# Altium schematic symbol library FPGA_Xilinx_Virtex5.SchLib: 41 symbols (part 5 of 17) (continued)
## XC5VLX30T-FF665 (continued)
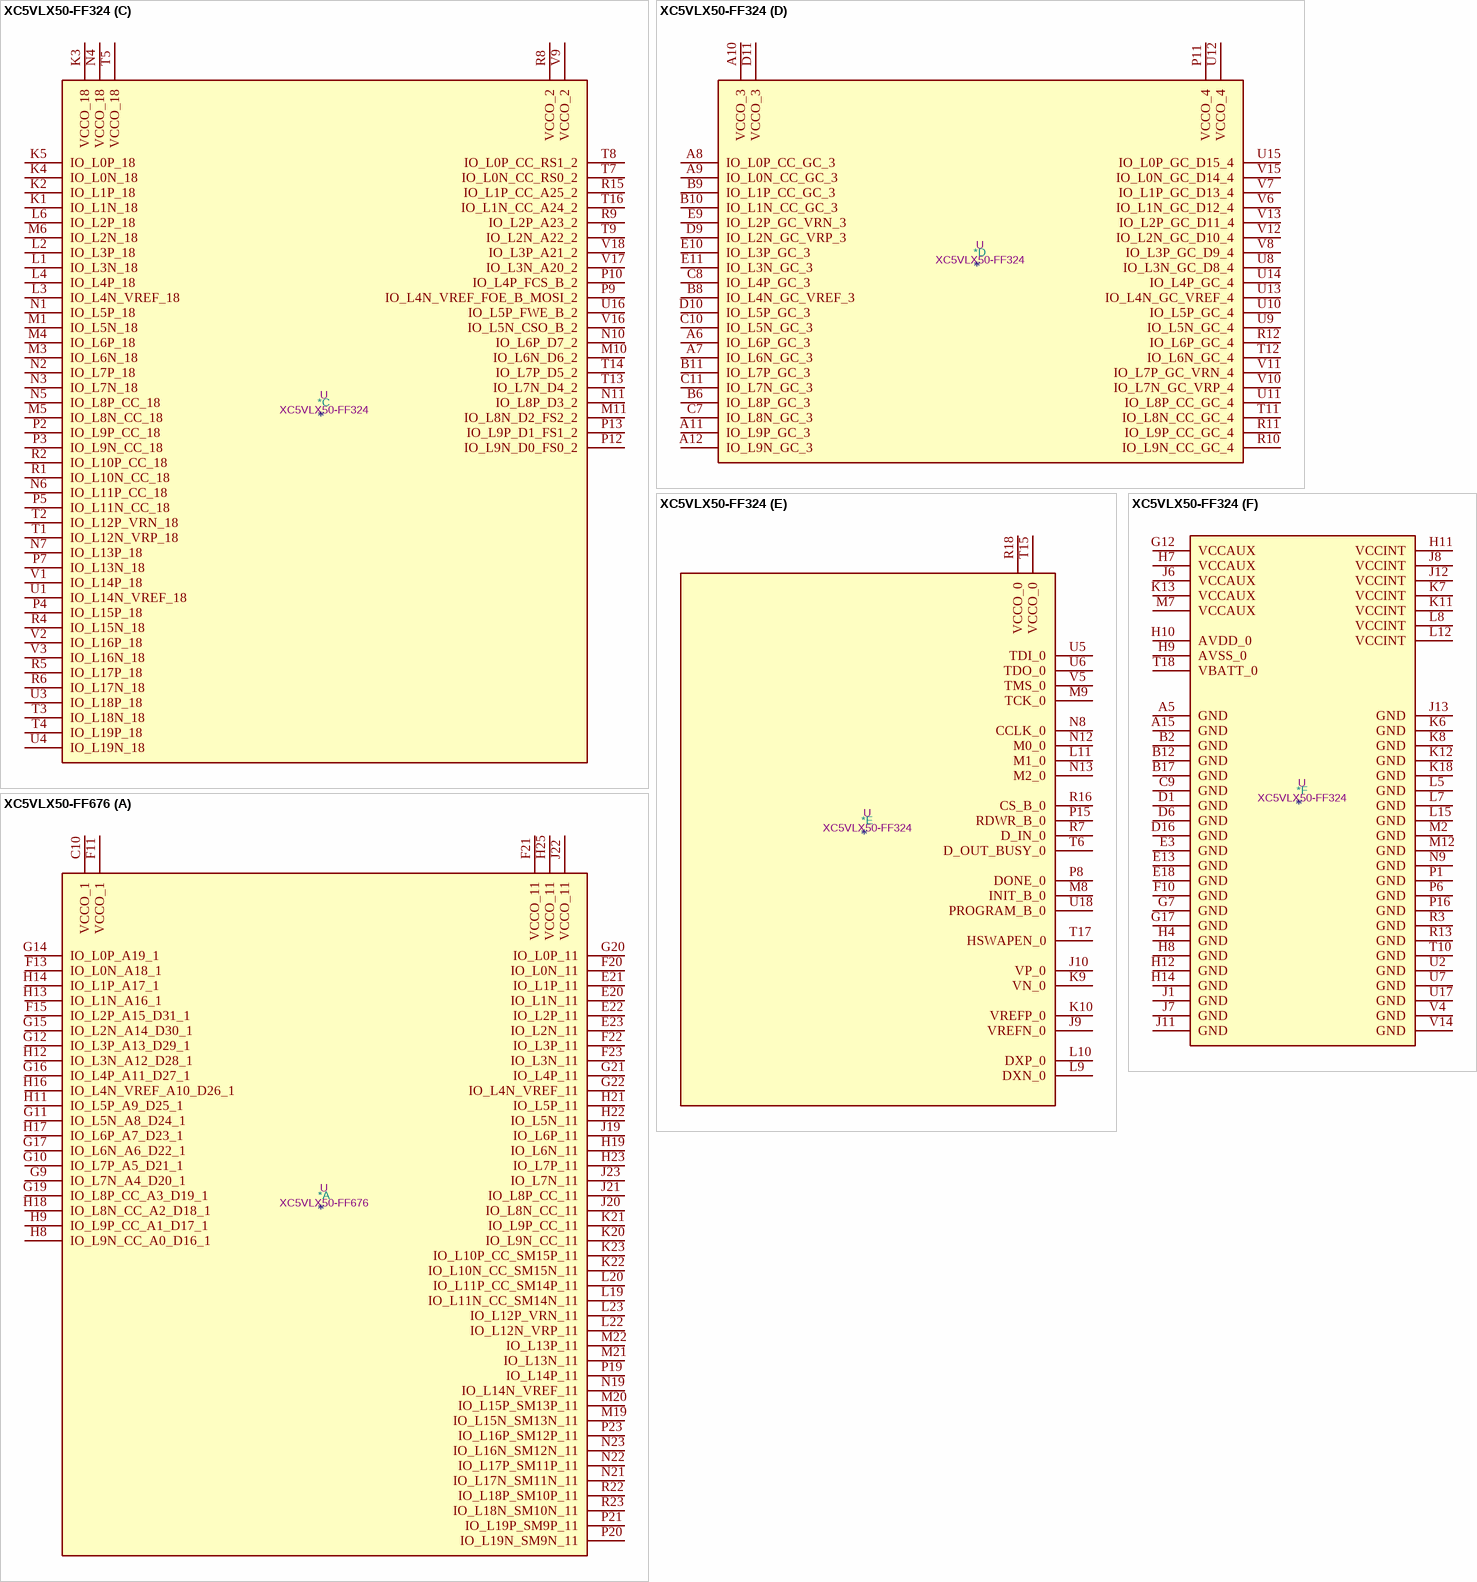
[diagram p35: symbols XC5VLX50-FF324 to XC5VLX50-FF676]

## XC5VLX50-FF324
designator *  value XC5VLX50-FF324  Reference: U
ki_keywords: FPGA; ki_description: Virtex 5 LX 50 XC5VLX50-FF324
part A pins: A13 IO_L1P_11, A14 IO_L1N_11, A16 IO_L3N_11, A17 IO_L5P_11, A18 IO_L5N_11, B7 VCCO_1, B13 IO_L6N_11, B14 IO_L2P_11, B15 IO_L2N_11, B16 IO_L3P_11, B18 IO_L7P_11, C6 IO_L9N_CC_A0_D16_1, C12 IO_L4P_A11_D27_1, C13 IO_L6P_11, C14 VCCO_11, C15 IO_L0P_11, C16 IO_L0N_11, C17 IO_L7N_11, C18 IO_L12N_VRP_11, D7 IO_L9P_CC_A1_D17_1, D8 IO_L7P_A5_D21_1, D12 IO_L2N_A14_D30_1, D13 IO_L4N_VREF_A10_D26_1, D14 IO_L4P_11, D15 IO_L11P_CC_SM14P_11, D17 IO_L10N_CC_SM15N_11, D18 IO_L12P_VRN_11, E7 IO_L7N_A4_D20_1, E8 VCCO_1, E12 IO_L2P_A15_D31_1, E14 IO_L4N_VREF_11, E15 IO_L11N_CC_SM14N_11, E16 IO_L9N_CC_11, E17 IO_L10P_CC_SM15P_11, F7 IO_L5N_A8_D24_1, F8 IO_L3P_A13_D29_1, F9 IO_L1N_A16_1, F11 IO_L0P_A19_1, F12 IO_L6P_A7_D23_1, F13 IO_L6N_A6_D22_1, F14 IO_L8P_CC_11, F15 VCCO_11, F16 IO_L9P_CC_11, F17 IO_L14N_VREF_11, F18 IO_L14P_11, G8 IO_L5P_A9_D25_1, G9 IO_L3N_A12_D28_1, G10 IO_L1P_A17_1, G11 IO_L0N_A18_1, G13 IO_L8P_CC_A3_D19_1, G14 IO_L8N_CC_11, G15 IO_L13N_11, G16 IO_L15N_SM13N_11, G18 IO_L16N_SM12N_11, H13 IO_L8N_CC_A2_D18_1, H15 IO_L13P_11, H16 IO_L15P_SM13P_11, H17 IO_L17P_SM11P_11, H18 IO_L16P_SM12P_11, J14 IO_L19N_SM9N_11, J15 IO_L19P_SM9P_11, J16 VCCO_11, J17 IO_L17N_SM11N_11, J18 IO_L18N_SM10N_11, K17 IO_L18P_SM10P_11
part B pins: A1 IO_L10P_CC_12, A2 IO_L10N_CC_12, A3 IO_L5P_12, A4 IO_L3N_12, B1 IO_L12N_VRP_12, B3 IO_L5N_12, B4 IO_L3P_12, B5 IO_L1P_12, C1 IO_L12P_VRN_12, C2 IO_L9N_CC_12, C3 IO_L7P_12, C4 VCCO_12, C5 IO_L1N_12, D2 IO_L9P_CC_12, D3 IO_L7N_12, D4 IO_L2N_12, D5 IO_L2P_12, E1 IO_L14N_VREF_12, E2 IO_L18P_12, E4 IO_L4N_VREF_12, E5 IO_L4P_12, E6 IO_L0P_12, F1 IO_L14P_12, F2 IO_L18N_12, F3 IO_L13N_12, F4 IO_L11N_CC_12, F5 VCCO_12, F6 IO_L0N_12, G1 IO_L19P_12, G2 VCCO_12, G3 IO_L13P_12, G4 IO_L11P_CC_12, G5 IO_L6P_12, G6 IO_L6N_12, H1 IO_L19N_12, H2 IO_L17P_12, H3 IO_L16P_12, H5 IO_L8N_CC_12, H6 IO_L8P_CC_12, J2 IO_L17N_12, J3 IO_L16N_12, J4 IO_L15N_12, J5 IO_L15P_12, K14 IO_L2P_SM6P_13, K15 IO_L0P_SM8P_13, K16 IO_L1N_SM7N_13, L13 IO_L4P_13, L14 IO_L2N_SM6N_13, L16 IO_L0N_SM8N_13, L17 IO_L1P_SM7P_13, L18 IO_L3N_SM5N_13, M13 IO_L4N_VREF_13, M14 IO_L6P_SM3P_13, M15 IO_L8P_CC_SM1P_13, M16 IO_L8N_CC_SM1N_13, M17 VCCO_13, M18 IO_L3P_SM5P_13, N14 VCCO_13, N15 IO_L6N_SM3N_13, N16 IO_L9P_CC_SM0P_13, N17 IO_L9N_CC_SM0N_13, N18 IO_L5N_SM4N_13, P17 IO_L7P_SM2P_13, P18 IO_L5P_SM4P_13, R17 IO_L7N_SM2N_13
part C pins: K1 IO_L1N_18, K2 IO_L1P_18, K3 VCCO_18, K4 IO_L0N_18, K5 IO_L0P_18, L1 IO_L3N_18, L2 IO_L3P_18, L3 IO_L4N_VREF_18, L4 IO_L4P_18, L6 IO_L2P_18, M1 IO_L5N_18, M3 IO_L6N_18, M4 IO_L6P_18, M5 IO_L8N_CC_18, M6 IO_L2N_18, M10 IO_L6N_D6_2, M11 IO_L8N_D2_FS2_2, N1 IO_L5P_18, N2 IO_L7P_18, N3 IO_L7N_18, N4 VCCO_18, N5 IO_L8P_CC_18, N6 IO_L11P_CC_18, N7 IO_L13P_18, N10 IO_L6P_D7_2, N11 IO_L8P_D3_2, P2 IO_L9P_CC_18, P3 IO_L9N_CC_18, P4 IO_L15P_18, P5 IO_L11N_CC_18, P7 IO_L13N_18, P9 IO_L4N_VREF_FOE_B_MOSI_2, P10 IO_L4P_FCS_B_2, P12 IO_L9N_D0_FS0_2, P13 IO_L9P_D1_FS1_2, R1 IO_L10N_CC_18, R2 IO_L10P_CC_18, R4 IO_L15N_18, R5 IO_L17P_18, R6 IO_L17N_18, R8 VCCO_2, R9 IO_L2P_A23_2, R15 IO_L1P_CC_A25_2, T1 IO_L12N_VRP_18, T2 IO_L12P_VRN_18, T3 IO_L18N_18, T4 IO_L19P_18, T5 VCCO_18, T7 IO_L0N_CC_RS0_2, T8 IO_L0P_CC_RS1_2, T9 IO_L2N_A22_2, T13 IO_L7N_D4_2, T14 IO_L7P_D5_2, T16 IO_L1N_CC_A24_2, U1 IO_L14N_VREF_18, U3 IO_L18P_18, U4 IO_L19N_18, U16 IO_L5P_FWE_B_2, V1 IO_L14P_18, V2 IO_L16P_18, V3 IO_L16N_18, V9 VCCO_2, V16 IO_L5N_CSO_B_2, V17 IO_L3N_A20_2, V18 IO_L3P_A21_2
part D pins: A6 IO_L6P_GC_3, A7 IO_L6N_GC_3, A8 IO_L0P_CC_GC_3, A9 IO_L0N_CC_GC_3, A10 VCCO_3, A11 IO_L9P_GC_3, A12 IO_L9N_GC_3, B6 IO_L8P_GC_3, B8 IO_L4N_GC_VREF_3, B9 IO_L1P_CC_GC_3, B10 IO_L1N_CC_GC_3, B11 IO_L7P_GC_3, C7 IO_L8N_GC_3, C8 IO_L4P_GC_3, C10 IO_L5N_GC_3, C11 IO_L7N_GC_3, D9 IO_L2N_GC_VRP_3, D10 IO_L5P_GC_3, D11 VCCO_3, E9 IO_L2P_GC_VRN_3, E10 IO_L3P_GC_3, E11 IO_L3N_GC_3, P11 VCCO_4, R10 IO_L9N_CC_GC_4, R11 IO_L9P_CC_GC_4, R12 IO_L6P_GC_4, T11 IO_L8N_CC_GC_4, T12 IO_L6N_GC_4, U8 IO_L3N_GC_D8_4, U9 IO_L5N_GC_4, U10 IO_L5P_GC_4, U11 IO_L8P_CC_GC_4, U12 VCCO_4, U13 IO_L4N_GC_VREF_4, U14 IO_L4P_GC_4, U15 IO_L0P_GC_D15_4, V6 IO_L1N_GC_D12_4, V7 IO_L1P_GC_D13_4, V8 IO_L3P_GC_D9_4, V10 IO_L7N_GC_VRP_4, V11 IO_L7P_GC_VRN_4, V12 IO_L2N_GC_D10_4, V13 IO_L2P_GC_D11_4, V15 IO_L0N_GC_D14_4
part E pins: J9 VREFN_0, J10 VP_0, K9 VN_0, K10 VREFP_0, L9 DXN_0, L10 DXP_0, L11 M1_0, M8 INIT_B_0, M9 TCK_0, N8 CCLK_0, N12 M0_0, N13 M2_0, P8 DONE_0, P15 RDWR_B_0, R7 D_IN_0, R16 CS_B_0, R18 VCCO_0, T6 D_OUT_BUSY_0, T15 VCCO_0, T17 HSWAPEN_0, U5 TDI_0, U6 TDO_0, U18 PROGRAM_B_0, V5 TMS_0
part F pins: A5 GND, A15 GND, B2 GND, B12 GND, B17 GND, C9 GND, D1 GND, D6 GND, D16 GND, E3 GND, E13 GND, E18 GND, F10 GND, G7 GND, G12 VCCAUX, G17 GND, H4 GND, H7 VCCAUX, H8 GND, H9 AVSS_0, H10 AVDD_0, H11 VCCINT, H12 GND, H14 GND, J1 GND, J6 VCCAUX, J7 GND, J8 VCCINT, J11 GND, J12 VCCINT, J13 GND, K6 GND, K7 VCCINT, K8 GND, K11 VCCINT, K12 GND, K13 VCCAUX, K18 GND, L5 GND, L7 GND, L8 VCCINT, L12 VCCINT, L15 GND, M2 GND, M7 VCCAUX, M12 GND, N9 GND, P1 GND, P6 GND, P16 GND, R3 GND, R13 GND, T10 GND, T18 VBATT_0, U2 GND, U7 GND, U17 GND, V4 GND, V14 GND

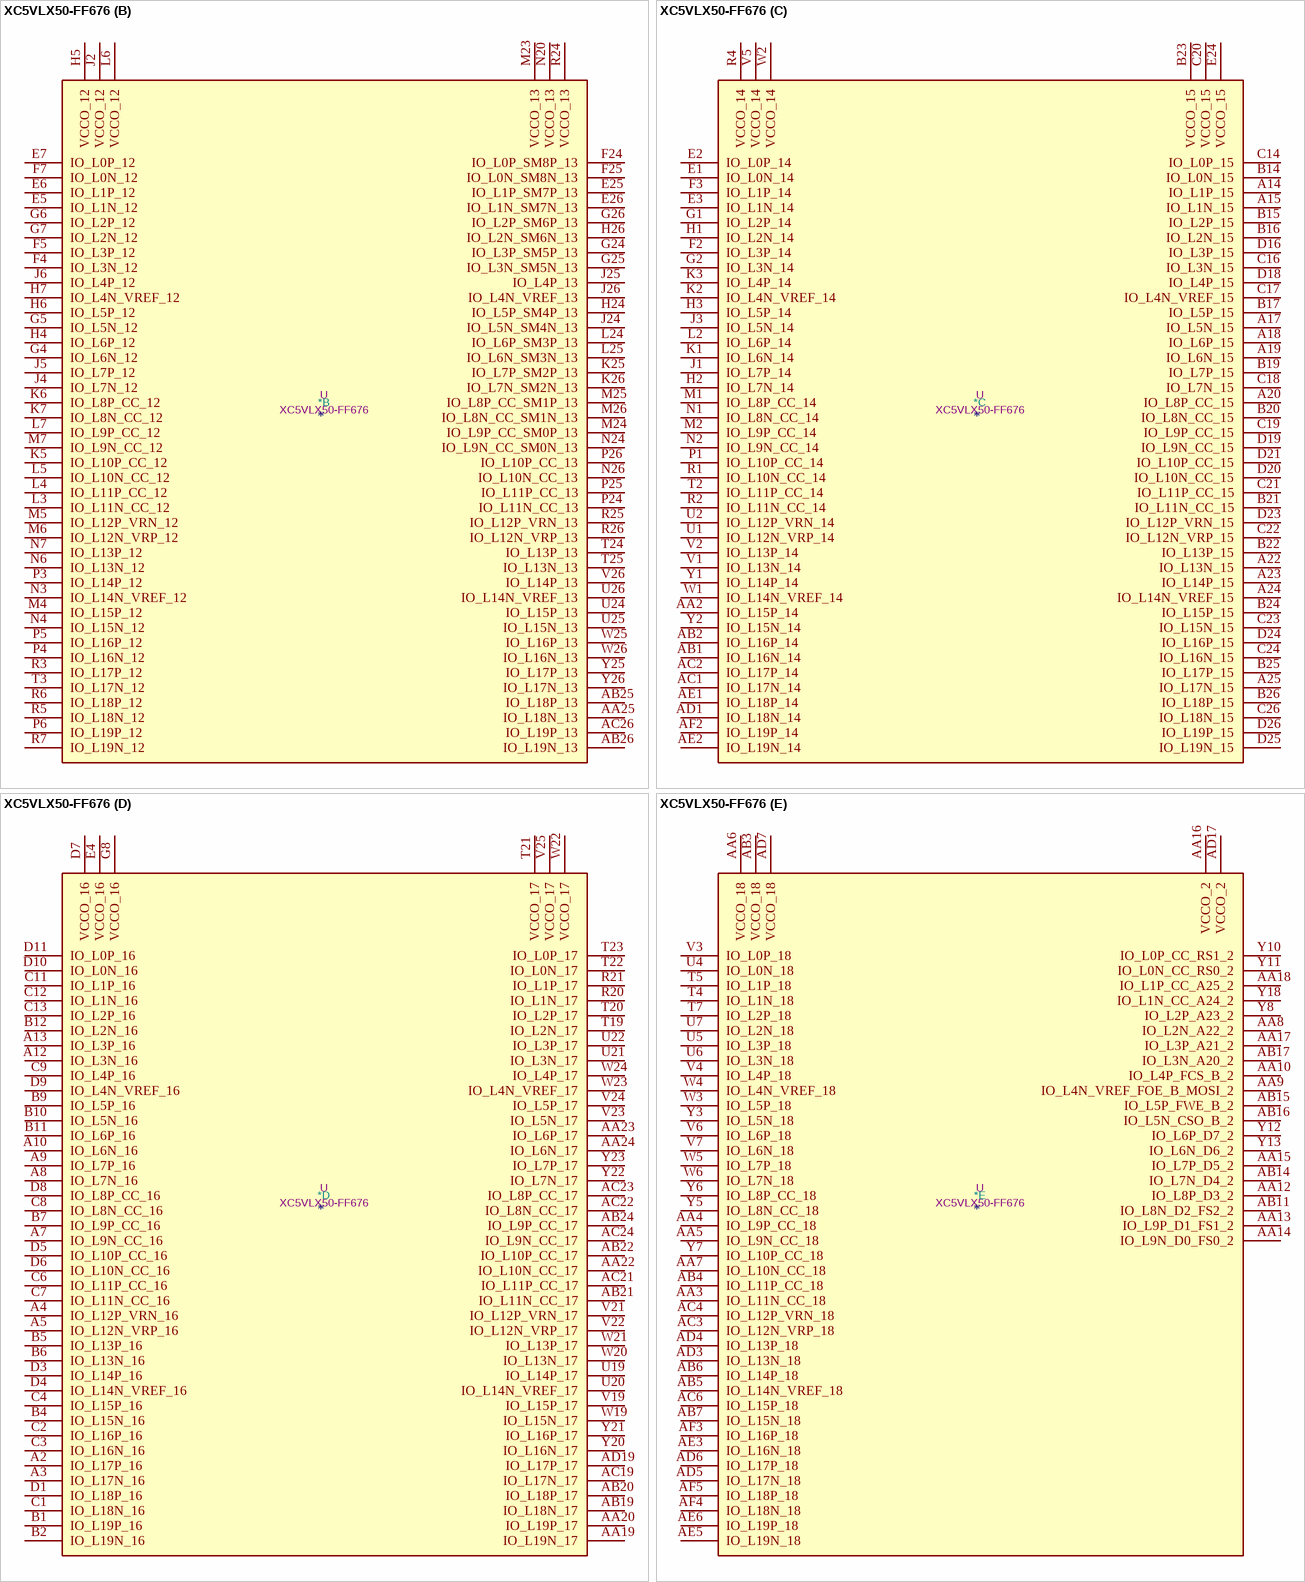
[diagram p36: symbol XC5VLX50-FF676]

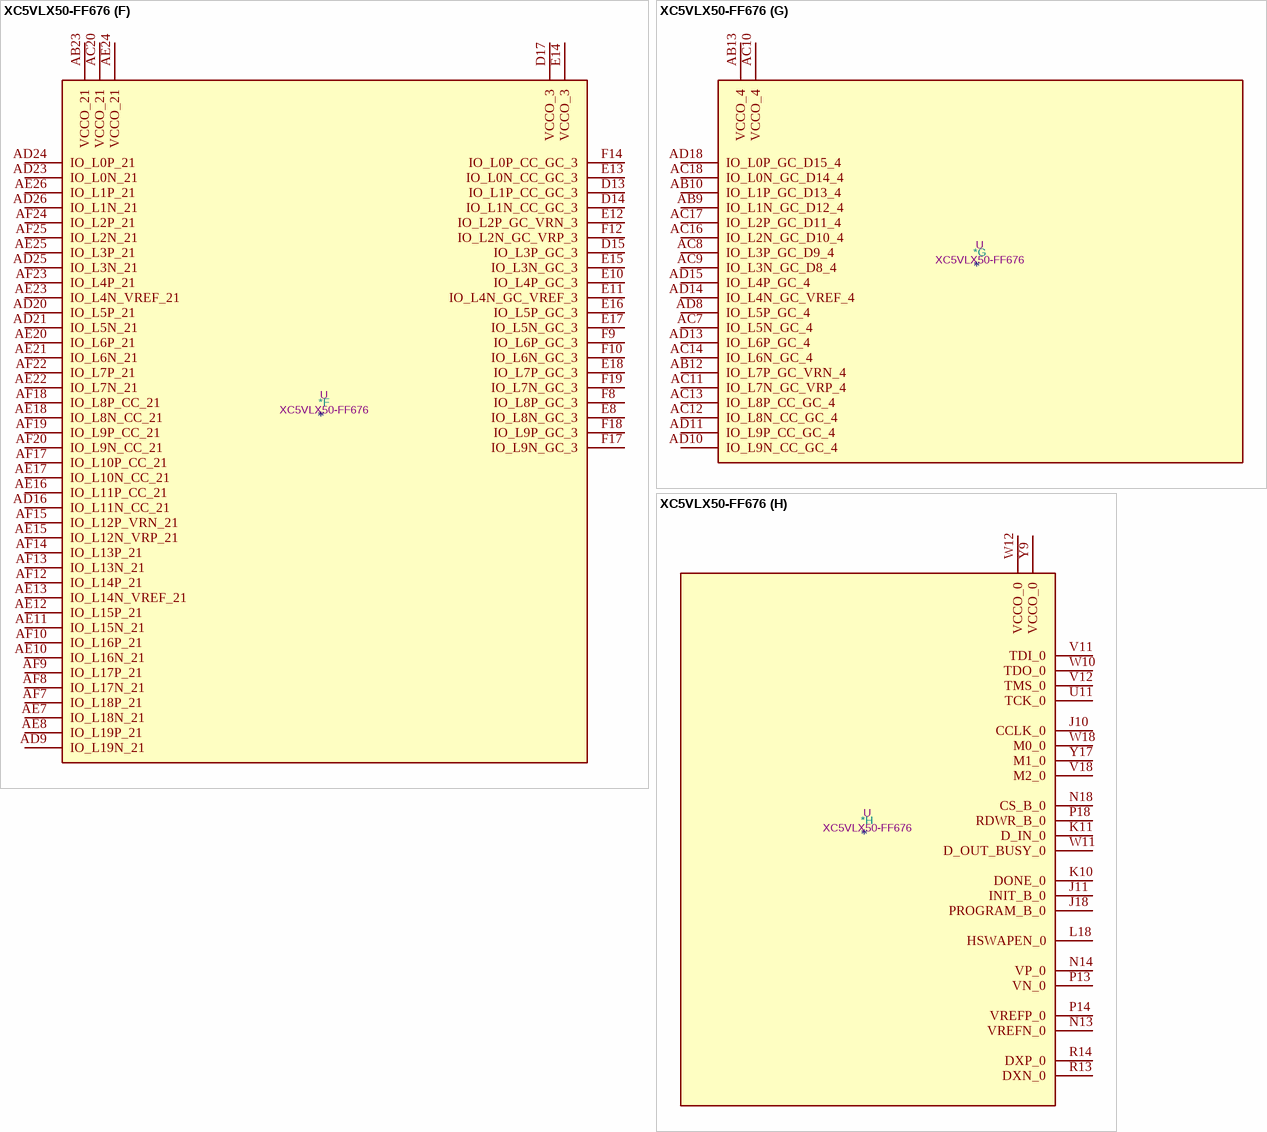
[diagram p37: symbol XC5VLX50-FF676]

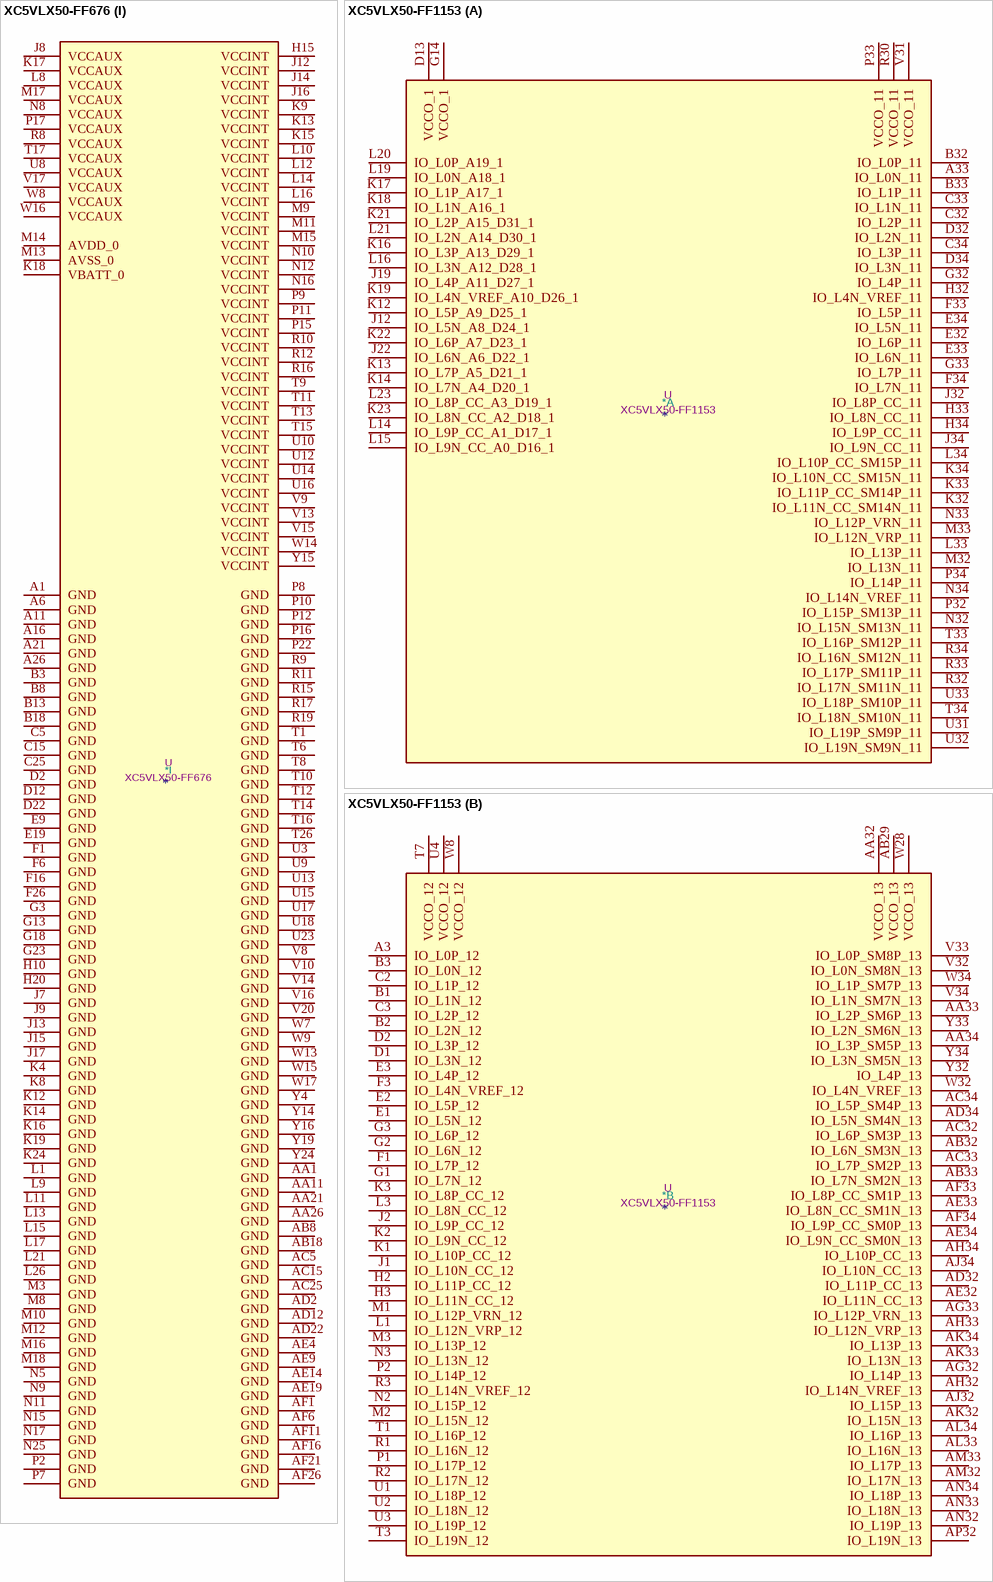
[diagram p38: symbols XC5VLX50-FF676 to XC5VLX50-FF1153]

## XC5VLX50-FF676
designator *  value XC5VLX50-FF676  Reference: U
ki_keywords: FPGA; ki_description: Virtex 5 LX 50 XC5VLX50-FF676
part A pins: C10 VCCO_1, E20 IO_L1N_11, E21 IO_L1P_11, E22 IO_L2P_11, E23 IO_L2N_11, F11 VCCO_1, F13 IO_L0N_A18_1, F15 IO_L2P_A15_D31_1, F20 IO_L0N_11, F21 VCCO_11, F22 IO_L3P_11, F23 IO_L3N_11, G9 IO_L7N_A4_D20_1, G10 IO_L7P_A5_D21_1, G11 IO_L5N_A8_D24_1, G12 IO_L3P_A13_D29_1, G14 IO_L0P_A19_1, G15 IO_L2N_A14_D30_1, G16 IO_L4P_A11_D27_1, G17 IO_L6N_A6_D22_1, G19 IO_L8P_CC_A3_D19_1, G20 IO_L0P_11, G21 IO_L4P_11, G22 IO_L4N_VREF_11, H8 IO_L9N_CC_A0_D16_1, H9 IO_L9P_CC_A1_D17_1, H11 IO_L5P_A9_D25_1, H12 IO_L3N_A12_D28_1, H13 IO_L1N_A16_1, H14 IO_L1P_A17_1, H16 IO_L4N_VREF_A10_D26_1, H17 IO_L6P_A7_D23_1, H18 IO_L8N_CC_A2_D18_1, H19 IO_L6N_11, H21 IO_L5P_11, H22 IO_L5N_11, H23 IO_L7P_11, H25 VCCO_11, J19 IO_L6P_11, J20 IO_L8N_CC_11, J21 IO_L8P_CC_11, J22 VCCO_11, J23 IO_L7N_11, K20 IO_L9N_CC_11, K21 IO_L9P_CC_11, K22 IO_L10N_CC_SM15N_11, K23 IO_L10P_CC_SM15P_11, L19 IO_L11N_CC_SM14N_11, L20 IO_L11P_CC_SM14P_11, L22 IO_L12N_VRP_11, L23 IO_L12P_VRN_11, M19 IO_L15N_SM13N_11, M20 IO_L15P_SM13P_11, M21 IO_L13N_11, M22 IO_L13P_11, N19 IO_L14N_VREF_11, N21 IO_L17N_SM11N_11, N22 IO_L17P_SM11P_11, N23 IO_L16N_SM12N_11, P19 IO_L14P_11, P20 IO_L19N_SM9N_11, P21 IO_L19P_SM9P_11, P23 IO_L16P_SM12P_11, R22 IO_L18P_SM10P_11, R23 IO_L18N_SM10N_11
part B pins: AA25 IO_L18N_13, AB25 IO_L18P_13, AB26 IO_L19N_13, AC26 IO_L19P_13, E5 IO_L1N_12, E6 IO_L1P_12, E7 IO_L0P_12, E25 IO_L1P_SM7P_13, E26 IO_L1N_SM7N_13, F4 IO_L3N_12, F5 IO_L3P_12, F7 IO_L0N_12, F24 IO_L0P_SM8P_13, F25 IO_L0N_SM8N_13, G4 IO_L6N_12, G5 IO_L5N_12, G6 IO_L2P_12, G7 IO_L2N_12, G24 IO_L3P_SM5P_13, G25 IO_L3N_SM5N_13, G26 IO_L2P_SM6P_13, H4 IO_L6P_12, H5 VCCO_12, H6 IO_L5P_12, H7 IO_L4N_VREF_12, H24 IO_L5P_SM4P_13, H26 IO_L2N_SM6N_13, J2 VCCO_12, J4 IO_L7N_12, J5 IO_L7P_12, J6 IO_L4P_12, J24 IO_L5N_SM4N_13, J25 IO_L4P_13, J26 IO_L4N_VREF_13, K5 IO_L10P_CC_12, K6 IO_L8P_CC_12, K7 IO_L8N_CC_12, K25 IO_L7P_SM2P_13, K26 IO_L7N_SM2N_13, L3 IO_L11N_CC_12, L4 IO_L11P_CC_12, L5 IO_L10N_CC_12, L6 VCCO_12, L7 IO_L9P_CC_12, L24 IO_L6P_SM3P_13, L25 IO_L6N_SM3N_13, M4 IO_L15P_12, M5 IO_L12P_VRN_12, M6 IO_L12N_VRP_12, M7 IO_L9N_CC_12, M23 VCCO_13, M24 IO_L9P_CC_SM0P_13, M25 IO_L8P_CC_SM1P_13, M26 IO_L8N_CC_SM1N_13, N3 IO_L14N_VREF_12, N4 IO_L15N_12, N6 IO_L13N_12, N7 IO_L13P_12, N20 VCCO_13, N24 IO_L9N_CC_SM0N_13, N26 IO_L10N_CC_13, P3 IO_L14P_12, P4 IO_L16N_12, P5 IO_L16P_12, P6 IO_L19P_12, P24 IO_L11N_CC_13, P25 IO_L11P_CC_13, P26 IO_L10P_CC_13, R3 IO_L17P_12, R5 IO_L18N_12, R6 IO_L18P_12, R7 IO_L19N_12, R24 VCCO_13, R25 IO_L12P_VRN_13, R26 IO_L12N_VRP_13, T3 IO_L17N_12, T24 IO_L13P_13, T25 IO_L13N_13, U24 IO_L15P_13, U25 IO_L15N_13, U26 IO_L14N_VREF_13, V26 IO_L14P_13, W25 IO_L16P_13, W26 IO_L16N_13, Y25 IO_L17P_13, Y26 IO_L17N_13
part C pins: A14 IO_L1P_15, A15 IO_L1N_15, A17 IO_L5N_15, A18 IO_L6P_15, A19 IO_L6N_15, A20 IO_L8P_CC_15, A22 IO_L13N_15, A23 IO_L14P_15, A24 IO_L14N_VREF_15, A25 IO_L17N_15, AA2 IO_L15P_14, AB1 IO_L16N_14, AB2 IO_L16P_14, AC1 IO_L17N_14, AC2 IO_L17P_14, AD1 IO_L18N_14, AE1 IO_L18P_14, AE2 IO_L19N_14, AF2 IO_L19P_14, B14 IO_L0N_15, B15 IO_L2P_15, B16 IO_L2N_15, B17 IO_L5P_15, B19 IO_L7P_15, B20 IO_L8N_CC_15, B21 IO_L11N_CC_15, B22 IO_L13P_15, B23 VCCO_15, B24 IO_L15P_15, B25 IO_L17P_15, B26 IO_L18P_15, C14 IO_L0P_15, C16 IO_L3N_15, C17 IO_L4N_VREF_15, C18 IO_L7N_15, C19 IO_L9P_CC_15, C20 VCCO_15, C21 IO_L11P_CC_15, C22 IO_L12N_VRP_15, C23 IO_L15N_15, C24 IO_L16N_15, C26 IO_L18N_15, D16 IO_L3P_15, D18 IO_L4P_15, D19 IO_L9N_CC_15, D20 IO_L10N_CC_15, D21 IO_L10P_CC_15, D23 IO_L12P_VRN_15, D24 IO_L16P_15, D25 IO_L19N_15, D26 IO_L19P_15, E1 IO_L0N_14, E2 IO_L0P_14, E3 IO_L1N_14, E24 VCCO_15, F2 IO_L3P_14, F3 IO_L1P_14, G1 IO_L2P_14, G2 IO_L3N_14, H1 IO_L2N_14, H2 IO_L7N_14, H3 IO_L5P_14, J1 IO_L7P_14, J3 IO_L5N_14, K1 IO_L6N_14, K2 IO_L4N_VREF_14, K3 IO_L4P_14, L2 IO_L6P_14, M1 IO_L8P_CC_14, M2 IO_L9P_CC_14, N1 IO_L8N_CC_14, N2 IO_L9N_CC_14, P1 IO_L10P_CC_14, R1 IO_L10N_CC_14, R2 IO_L11N_CC_14, R4 VCCO_14, T2 IO_L11P_CC_14, U1 IO_L12N_VRP_14, U2 IO_L12P_VRN_14, V1 IO_L13N_14, V2 IO_L13P_14, V5 VCCO_14, W1 IO_L14N_VREF_14, W2 VCCO_14, Y1 IO_L14P_14, Y2 IO_L15N_14
part D pins: A2 IO_L17P_16, A3 IO_L17N_16, A4 IO_L12P_VRN_16, A5 IO_L12N_VRP_16, A7 IO_L9N_CC_16, A8 IO_L7N_16, A9 IO_L7P_16, A10 IO_L6N_16, A12 IO_L3N_16, A13 IO_L3P_16, AA19 IO_L19N_17, AA20 IO_L19P_17, AA22 IO_L10N_CC_17, AA23 IO_L6P_17, AA24 IO_L6N_17, AB19 IO_L18N_17, AB20 IO_L18P_17, AB21 IO_L11N_CC_17, AB22 IO_L10P_CC_17, AB24 IO_L9P_CC_17, AC19 IO_L17N_17, AC21 IO_L11P_CC_17, AC22 IO_L8N_CC_17, AC23 IO_L8P_CC_17, AC24 IO_L9N_CC_17, AD19 IO_L17P_17, B1 IO_L19P_16, B2 IO_L19N_16, B4 IO_L15N_16, B5 IO_L13P_16, B6 IO_L13N_16, B7 IO_L9P_CC_16, B9 IO_L5P_16, B10 IO_L5N_16, B11 IO_L6P_16, B12 IO_L2N_16, C1 IO_L18N_16, C2 IO_L16P_16, C3 IO_L16N_16, C4 IO_L15P_16, C6 IO_L11P_CC_16, C7 IO_L11N_CC_16, C8 IO_L8N_CC_16, C9 IO_L4P_16, C11 IO_L1P_16, C12 IO_L1N_16, C13 IO_L2P_16, D1 IO_L18P_16, D3 IO_L14P_16, D4 IO_L14N_VREF_16, D5 IO_L10P_CC_16, D6 IO_L10N_CC_16, D7 VCCO_16, D8 IO_L8P_CC_16, D9 IO_L4N_VREF_16, D10 IO_L0N_16, D11 IO_L0P_16, E4 VCCO_16, G8 VCCO_16, R20 IO_L1N_17, R21 IO_L1P_17, T19 IO_L2N_17, T20 IO_L2P_17, T21 VCCO_17, T22 IO_L0N_17, T23 IO_L0P_17, U19 IO_L14P_17, U20 IO_L14N_VREF_17, U21 IO_L3N_17, U22 IO_L3P_17, V19 IO_L15P_17, V21 IO_L12P_VRN_17, V22 IO_L12N_VRP_17, V23 IO_L5N_17, V24 IO_L5P_17, V25 VCCO_17, W19 IO_L15N_17, W20 IO_L13N_17, W21 IO_L13P_17, W22 VCCO_17, W23 IO_L4N_VREF_17, W24 IO_L4P_17, Y20 IO_L16N_17, Y21 IO_L16P_17, Y22 IO_L7N_17, Y23 IO_L7P_17
part E pins: AA3 IO_L11N_CC_18, AA4 IO_L9P_CC_18, AA5 IO_L9N_CC_18, AA6 VCCO_18, AA7 IO_L10N_CC_18, AA8 IO_L2N_A22_2, AA9 IO_L4N_VREF_FOE_B_MOSI_2, AA10 IO_L4P_FCS_B_2, AA12 IO_L8P_D3_2, AA13 IO_L9P_D1_FS1_2, AA14 IO_L9N_D0_FS0_2, AA15 IO_L7P_D5_2, AA16 VCCO_2, AA17 IO_L3P_A21_2, AA18 IO_L1P_CC_A25_2, AB3 VCCO_18, AB4 IO_L11P_CC_18, AB5 IO_L14N_VREF_18, AB6 IO_L14P_18, AB7 IO_L15N_18, AB11 IO_L8N_D2_FS2_2, AB14 IO_L7N_D4_2, AB15 IO_L5P_FWE_B_2, AB16 IO_L5N_CSO_B_2, AB17 IO_L3N_A20_2, AC3 IO_L12N_VRP_18, AC4 IO_L12P_VRN_18, AC6 IO_L15P_18, AD3 IO_L13N_18, AD4 IO_L13P_18, AD5 IO_L17N_18, AD6 IO_L17P_18, AD7 VCCO_18, AD17 VCCO_2, AE3 IO_L16N_18, AE5 IO_L19N_18, AE6 IO_L19P_18, AF3 IO_L16P_18, AF4 IO_L18N_18, AF5 IO_L18P_18, T4 IO_L1N_18, T5 IO_L1P_18, T7 IO_L2P_18, U4 IO_L0N_18, U5 IO_L3P_18, U6 IO_L3N_18, U7 IO_L2N_18, V3 IO_L0P_18, V4 IO_L4P_18, V6 IO_L6P_18, V7 IO_L6N_18, W3 IO_L5P_18, W4 IO_L4N_VREF_18, W5 IO_L7P_18, W6 IO_L7N_18, Y3 IO_L5N_18, Y5 IO_L8N_CC_18, Y6 IO_L8P_CC_18, Y7 IO_L10P_CC_18, Y8 IO_L2P_A23_2, Y10 IO_L0P_CC_RS1_2, Y11 IO_L0N_CC_RS0_2, Y12 IO_L6P_D7_2, Y13 IO_L6N_D6_2, Y18 IO_L1N_CC_A24_2
part F pins: AB23 VCCO_21, AC20 VCCO_21, AD9 IO_L19N_21, AD16 IO_L11N_CC_21, AD20 IO_L5P_21, AD21 IO_L5N_21, AD23 IO_L0N_21, AD24 IO_L0P_21, AD25 IO_L3N_21, AD26 IO_L1N_21, AE7 IO_L18N_21, AE8 IO_L19P_21, AE10 IO_L16N_21, AE11 IO_L15N_21, AE12 IO_L15P_21, AE13 IO_L14N_VREF_21, AE15 IO_L12N_VRP_21, AE16 IO_L11P_CC_21, AE17 IO_L10N_CC_21, AE18 IO_L8N_CC_21, AE20 IO_L6P_21, AE21 IO_L6N_21, AE22 IO_L7N_21, AE23 IO_L4N_VREF_21, AE24 VCCO_21, AE25 IO_L3P_21, AE26 IO_L1P_21, AF7 IO_L18P_21, AF8 IO_L17N_21, AF9 IO_L17P_21, AF10 IO_L16P_21, AF12 IO_L14P_21, AF13 IO_L13N_21, AF14 IO_L13P_21, AF15 IO_L12P_VRN_21, AF17 IO_L10P_CC_21, AF18 IO_L8P_CC_21, AF19 IO_L9P_CC_21, AF20 IO_L9N_CC_21, AF22 IO_L7P_21, AF23 IO_L4P_21, AF24 IO_L2P_21, AF25 IO_L2N_21, D13 IO_L1P_CC_GC_3, D14 IO_L1N_CC_GC_3, D15 IO_L3P_GC_3, D17 VCCO_3, E8 IO_L8N_GC_3, E10 IO_L4P_GC_3, E11 IO_L4N_GC_VREF_3, E12 IO_L2P_GC_VRN_3, E13 IO_L0N_CC_GC_3, E14 VCCO_3, E15 IO_L3N_GC_3, E16 IO_L5P_GC_3, E17 IO_L5N_GC_3, E18 IO_L7P_GC_3, F8 IO_L8P_GC_3, F9 IO_L6P_GC_3, F10 IO_L6N_GC_3, F12 IO_L2N_GC_VRP_3, F14 IO_L0P_CC_GC_3, F17 IO_L9N_GC_3, F18 IO_L9P_GC_3, F19 IO_L7N_GC_3
part G pins: AB9 IO_L1N_GC_D12_4, AB10 IO_L1P_GC_D13_4, AB12 IO_L7P_GC_VRN_4, AB13 VCCO_4, AC7 IO_L5N_GC_4, AC8 IO_L3P_GC_D9_4, AC9 IO_L3N_GC_D8_4, AC10 VCCO_4, AC11 IO_L7N_GC_VRP_4, AC12 IO_L8N_CC_GC_4, AC13 IO_L8P_CC_GC_4, AC14 IO_L6N_GC_4, AC16 IO_L2N_GC_D10_4, AC17 IO_L2P_GC_D11_4, AC18 IO_L0N_GC_D14_4, AD8 IO_L5P_GC_4, AD10 IO_L9N_CC_GC_4, AD11 IO_L9P_CC_GC_4, AD13 IO_L6P_GC_4, AD14 IO_L4N_GC_VREF_4, AD15 IO_L4P_GC_4, AD18 IO_L0P_GC_D15_4
part H pins: J10 CCLK_0, J11 INIT_B_0, J18 PROGRAM_B_0, K10 DONE_0, K11 D_IN_0, L18 HSWAPEN_0, N13 VREFN_0, N14 VP_0, N18 CS_B_0, P13 VN_0, P14 VREFP_0, P18 RDWR_B_0, R13 DXN_0, R14 DXP_0, U11 TCK_0, V11 TDI_0, V12 TMS_0, V18 M2_0, W10 TDO_0, W11 D_OUT_BUSY_0, W12 VCCO_0, W18 M0_0, Y9 VCCO_0, Y17 M1_0
part I pins: A1 GND, A6 GND, A11 GND, A16 GND, A21 GND, A26 GND, AA1 GND, AA11 GND, AA21 GND, AA26 GND, AB8 GND, AB18 GND, AC5 GND, AC15 GND, AC25 GND, AD2 GND, AD12 GND, AD22 GND, AE4 GND, AE9 GND, AE14 GND, AE19 GND, AF1 GND, AF6 GND, AF11 GND, AF16 GND, AF21 GND, AF26 GND, B3 GND, B8 GND, B13 GND, B18 GND, C5 GND, C15 GND, C25 GND, D2 GND, D12 GND, D22 GND, E9 GND, E19 GND, F1 GND, F6 GND, F16 GND, F26 GND, G3 GND, G13 GND, G18 GND, G23 GND, H10 GND, H15 VCCINT, H20 GND, J7 GND, J8 VCCAUX, J9 GND, J12 VCCINT, J13 GND, J14 VCCINT, J15 GND, J16 VCCINT, J17 GND, K4 GND, K8 GND, K9 VCCINT, K12 GND, K13 VCCINT, K14 GND, K15 VCCINT, K16 GND, K17 VCCAUX, K18 VBATT_0, K19 GND, K24 GND, L1 GND, L8 VCCAUX, L9 GND, L10 VCCINT, L11 GND, L12 VCCINT, L13 GND, L14 VCCINT, L15 GND, L16 VCCINT, L17 GND, L21 GND, L26 GND, M3 GND, M8 GND, M9 VCCINT, M10 GND, M11 VCCINT, M12 GND, M13 AVSS_0, M14 AVDD_0, M15 VCCINT, M16 GND, M17 VCCAUX, M18 GND, N5 GND, N8 VCCAUX, N9 GND, N10 VCCINT, N11 GND, N12 VCCINT, N15 GND, N16 VCCINT, N17 GND, N25 GND, P2 GND, P7 GND, P8 GND, P9 VCCINT, P10 GND, P11 VCCINT, P12 GND, P15 VCCINT, P16 GND, P17 VCCAUX, P22 GND, R8 VCCAUX, R9 GND, R10 VCCINT, R11 GND, R12 VCCINT, R15 GND, R16 VCCINT, R17 GND, R19 GND, T1 GND, T6 GND, T8 GND, T9 VCCINT, T10 GND, T11 VCCINT, T12 GND, T13 VCCINT, T14 GND, T15 VCCINT, T16 GND, T17 VCCAUX, T26 GND, U3 GND, U8 VCCAUX, U9 GND, U10 VCCINT, U12 VCCINT, U13 GND, U14 VCCINT, U15 GND, U16 VCCINT, U17 GND, U18 GND, U23 GND, V8 GND, V9 VCCINT, V10 GND, V13 VCCINT, V14 GND, V15 VCCINT, V16 GND, V17 VCCAUX, V20 GND, W7 GND, W8 VCCAUX, W9 GND, W13 GND, W14 VCCINT, W15 GND, W16 VCCAUX, W17 GND, Y4 GND, Y14 GND, Y15 VCCINT, Y16 GND, Y19 GND, Y24 GND
